# Altium footprint library ACTION_PinHeader.PcbLib: 155 footprints (part 3 of 10)
Each footprint in its own frame and in the unit in brackets; x right, y up, seen from the top. Pads: shape width x height; smd on the part's side, far side on the other; paste and mask are expansions set on the pad; w line width, h text height; cw(c..) or ccw(c..) is an arc to the next point about the centre after c.
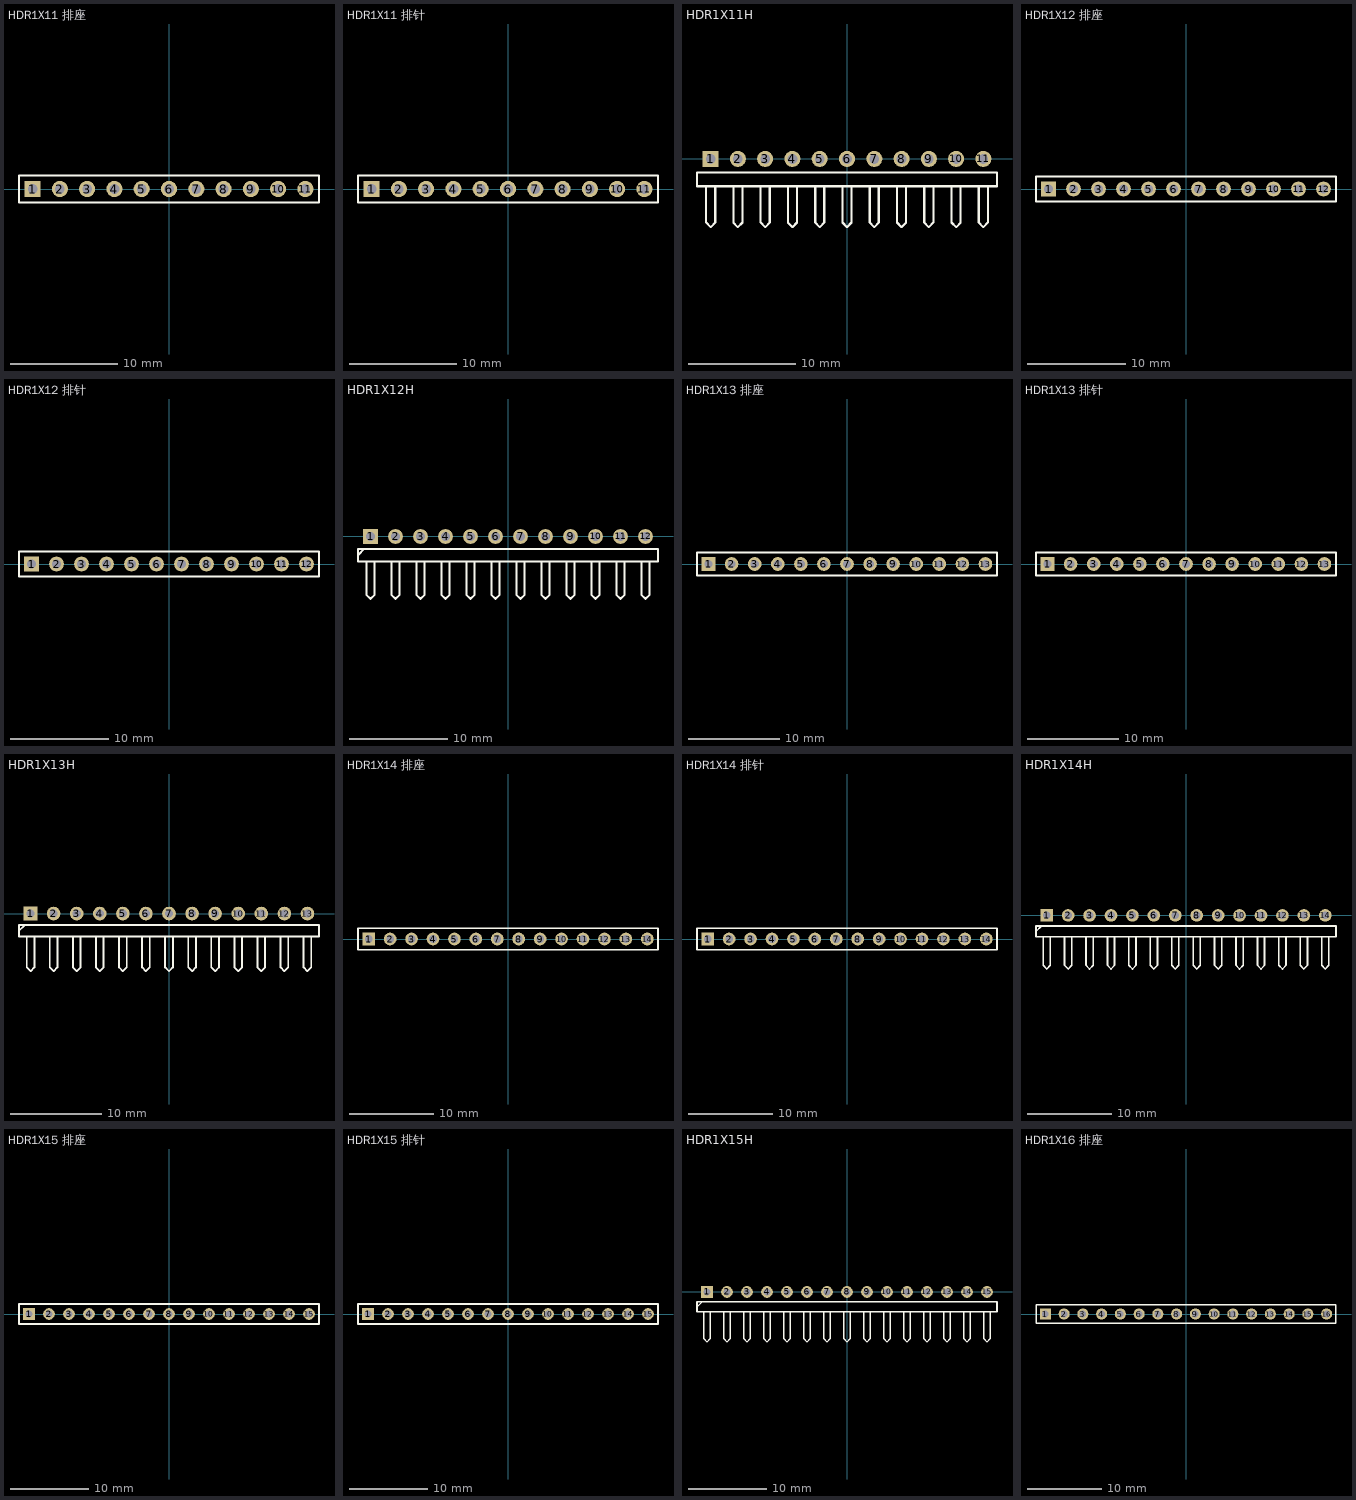
[diagram p2: the footprints below, top view; thin cyan lines are the x and y axes]

## HDR1X11 排座 [mm] "Connector; Header; 11 Position"
pads (11):
  rect 1.5x1.5 hole 0.9: 1(-12.7,0)
  round 1.5 hole 0.9: 2(-10.16,0) 3(-7.62,0) 4(-5.08,0) 5(-2.54,0) 6(0,0) 7(2.54,0) 8(5.08,0) 9(7.62,0) 10(10.16,0) 11(12.7,0)
Top Overlay:
  lines w0.2: -13.97,-1.27 13.97,-1.27 13.97,1.27 -12.065,1.27 -13.97,1.27 -13.97,-1.27
3D body "pcb_connector_801-87-011-66-001101.stp": height 7, standoff -3.8, extent -13.97,-1.27 13.97,1.27

## HDR1X11 排针 [mm] "Connector; Header; 11 Position"
pads (11):
  rect 1.5x1.5 hole 0.9: 1(-12.7,0)
  round 1.5 hole 0.9: 2(-10.16,0) 3(-7.62,0) 4(-5.08,0) 5(-2.54,0) 6(0,0) 7(2.54,0) 8(5.08,0) 9(7.62,0) 10(10.16,0) 11(12.7,0)
Top Overlay:
  lines w0.2: -13.97,-1.27 -13.97,1.27 -12.065,1.27 13.97,1.27 13.97,-1.27 -13.97,-1.27
3D body "HEADER 11.STEP": height 10.1, standoff -1.5, extent -13.945,-1.27 13.995,1.27

## HDR1X11H [mm] "Connector; Header; 11 Position; Right Angle"
pads (11):
  rect 1.5x1.5 hole 0.9: 1(-12.7,0)
  round 1.5 hole 0.9: 2(-10.16,0) 3(-7.62,0) 4(-5.08,0) 5(-2.54,0) 6(0,0) 7(2.54,0) 8(5.08,0) 9(7.62,0) 10(10.16,0) 11(12.7,0)
Top Overlay:
  lines w0.2: -13.123,-2.54 -13.123,-5.927 -12.7,-6.35 -12.277,-5.927 -12.277,-2.54 ; -10.583,-2.54 -10.583,-5.927 -10.16,-6.35 -9.737,-5.927 -9.737,-2.54 ; -8.043,-2.54 -8.043,-5.927 -7.62,-6.35 -7.197,-5.927 -7.197,-2.54 ; -5.503,-2.54 -5.503,-5.927 -5.08,-6.35 -4.657,-5.927 -4.657,-2.54 ; -2.963,-2.54 -2.963,-5.927 -2.54,-6.35 -2.117,-5.927 -2.117,-2.54 ; -0.423,-2.54 -0.423,-5.927 0,-6.35 0.423,-5.927 0.423,-2.54 ; 2.117,-2.54 2.117,-5.927 2.54,-6.35 2.963,-5.927 2.963,-2.54 ; 4.657,-2.54 4.657,-5.927 5.08,-6.35 5.503,-5.927 5.503,-2.54 ; 7.197,-2.54 7.197,-5.927 7.62,-6.35 8.043,-5.927 8.043,-2.54 ; 9.737,-2.54 9.737,-5.927 10.16,-6.35 10.583,-5.927 10.583,-2.54 ; 12.277,-2.54 12.277,-5.927 12.7,-6.35 13.123,-5.927 13.123,-2.54 ; -13.97,-2.54 13.97,-2.54 13.97,-1.27 -13.97,-1.27 -13.97,-2.54
3D body "HEADER 11H.STEP": height 4.33, standoff -3, extent -13.97,-6.949 13.97,1.321

## HDR1X12 排座 [mm] "Connector; Header; 12 Position"
pads (12):
  rect 1.5x1.5 hole 0.9: 1(-13.97,0)
  round 1.5 hole 0.9: 2(-11.43,0) 3(-8.89,0) 4(-6.35,0) 5(-3.81,0) 6(-1.27,0) 7(1.27,0) 8(3.81,0) 9(6.35,0) 10(8.89,0) 11(11.43,0) 12(13.97,0)
Top Overlay:
  lines w0.2: -15.24,-1.27 -15.24,1.27 -13.335,1.27 15.24,1.27 15.24,-1.27 -15.24,-1.27
3D body "pcb_connector_801-87-012-66-001101.stp": height 7, standoff -3.8, extent -15.24,-1.27 15.24,1.27

## HDR1X12 排针 [mm] "Connector; Header; 12 Position"
pads (12):
  rect 1.5x1.5 hole 0.9: 1(-13.97,0)
  round 1.5 hole 0.9: 2(-11.43,0) 3(-8.89,0) 4(-6.35,0) 5(-3.81,0) 6(-1.27,0) 7(1.27,0) 8(3.81,0) 9(6.35,0) 10(8.89,0) 11(11.43,0) 12(13.97,0)
Top Overlay:
  lines w0.2: -15.24,-1.27 15.24,-1.27 15.24,1.27 -13.335,1.27 -15.24,1.27 -15.24,-1.27
3D body "HEADER 12.STEP": height 10.1, standoff -1.5, extent -15.24,-1.245 15.24,1.295

## HDR1X12H [mm] "Connector; Header; 12 Position; Right Angle"
pads (12):
  rect 1.5x1.5 hole 0.9: 1(-13.97,0)
  round 1.5 hole 0.9: 2(-11.43,0) 3(-8.89,0) 4(-6.35,0) 5(-3.81,0) 6(-1.27,0) 7(1.27,0) 8(3.81,0) 9(6.35,0) 10(8.89,0) 11(11.43,0) 12(13.97,0)
Top Overlay:
  lines w0.2: -15.24,-1.905 -14.605,-1.27 ; -14.393,-2.54 -14.393,-5.927 -13.97,-6.35 -13.547,-5.927 -13.547,-2.54 ; -11.853,-2.54 -11.853,-5.927 -11.43,-6.35 -11.007,-5.927 -11.007,-2.54 ; -9.313,-2.54 -9.313,-5.927 -8.89,-6.35 -8.467,-5.927 -8.467,-2.54 ; -6.773,-2.54 -6.773,-5.927 -6.35,-6.35 -5.927,-5.927 -5.927,-2.54 ; -4.233,-2.54 -4.233,-5.927 -3.81,-6.35 -3.387,-5.927 -3.387,-2.54 ; -1.693,-2.54 -1.693,-5.927 -1.27,-6.35 -0.847,-5.927 -0.847,-2.54 ; 0.847,-2.54 0.847,-5.927 1.27,-6.35 1.693,-5.927 1.693,-2.54 ; 3.387,-2.54 3.387,-5.927 3.81,-6.35 4.233,-5.927 4.233,-2.54 ; 5.927,-2.54 5.927,-5.927 6.35,-6.35 6.773,-5.927 6.773,-2.54 ; 8.467,-2.54 8.467,-5.927 8.89,-6.35 9.313,-5.927 9.313,-2.54 ; 11.007,-2.54 11.007,-5.927 11.43,-6.35 11.853,-5.927 11.853,-2.54 ; 13.547,-2.54 13.547,-5.927 13.97,-6.35 14.393,-5.927 14.393,-2.54 ; -15.24,-2.54 -15.24,-1.27 -13.335,-1.27 15.24,-1.27 15.24,-2.54 -15.24,-2.54
3D body "HEADER 12H.STEP": height 4.33, standoff -3, extent -15.24,-7.025 15.24,1.245

## HDR1X13 排座 [mm] "Connector; Header; 13 Position"
pads (13):
  rect 1.5x1.5 hole 0.9: 1(-15.24,0)
  round 1.5 hole 0.9: 2(-12.7,0) 3(-10.16,0) 4(-7.62,0) 5(-5.08,0) 6(-2.54,0) 7(0,0) 8(2.54,0) 9(5.08,0) 10(7.62,0) 11(10.16,0) 12(12.7,0) 13(15.24,0)
Top Overlay:
  lines w0.2: -16.51,-1.27 16.51,-1.27 16.51,1.27 -14.605,1.27 -16.51,1.27 -16.51,-1.27
3D body "pcb_connector_801-87-013-66-001101.stp": height 7, standoff -3.8, extent -16.51,-1.27 16.51,1.27

## HDR1X13 排针 [mm] "Connector; Header; 13 Position"
pads (13):
  rect 1.5x1.5 hole 0.9: 1(-15.24,0)
  round 1.5 hole 0.9: 2(-12.7,0) 3(-10.16,0) 4(-7.62,0) 5(-5.08,0) 6(-2.54,0) 7(0,0) 8(2.54,0) 9(5.08,0) 10(7.62,0) 11(10.16,0) 12(12.7,0) 13(15.24,0)
Top Overlay:
  lines w0.2: -16.51,-1.27 -16.51,1.27 -14.605,1.27 16.51,1.27 16.51,-1.27 -16.51,-1.27
3D body "HEADER 13.STEP": height 10.1, standoff -1.5, extent -16.51,-1.27 16.51,1.27

## HDR1X13H [mm] "Connector; Header; 13 Position; Right Angle"
pads (13):
  rect 1.5x1.5 hole 0.9: 1(-15.24,0)
  round 1.5 hole 0.9: 2(-12.7,0) 3(-10.16,0) 4(-7.62,0) 5(-5.08,0) 6(-2.54,0) 7(0,0) 8(2.54,0) 9(5.08,0) 10(7.62,0) 11(10.16,0) 12(12.7,0) 13(15.24,0)
Top Overlay:
  lines w0.2: -16.51,-1.905 -15.875,-1.27 ; -15.663,-2.54 -15.663,-5.927 -15.24,-6.35 -14.817,-5.927 -14.817,-2.54 ; -13.123,-2.54 -13.123,-5.927 -12.7,-6.35 -12.277,-5.927 -12.277,-2.54 ; -10.583,-2.54 -10.583,-5.927 -10.16,-6.35 -9.737,-5.927 -9.737,-2.54 ; -8.043,-2.54 -8.043,-5.927 -7.62,-6.35 -7.197,-5.927 -7.197,-2.54 ; -5.503,-2.54 -5.503,-5.927 -5.08,-6.35 -4.657,-5.927 -4.657,-2.54 ; -2.963,-2.54 -2.963,-5.927 -2.54,-6.35 -2.117,-5.927 -2.117,-2.54 ; -0.423,-2.54 -0.423,-5.927 0,-6.35 0.423,-5.927 0.423,-2.54 ; 2.117,-2.54 2.117,-5.927 2.54,-6.35 2.963,-5.927 2.963,-2.54 ; 4.657,-2.54 4.657,-5.927 5.08,-6.35 5.503,-5.927 5.503,-2.54 ; 7.197,-2.54 7.197,-5.927 7.62,-6.35 8.043,-5.927 8.043,-2.54 ; 9.737,-2.54 9.737,-5.927 10.16,-6.35 10.583,-5.927 10.583,-2.54 ; 12.277,-2.54 12.277,-5.927 12.7,-6.35 13.123,-5.927 13.123,-2.54 ; 14.817,-2.54 14.817,-5.927 15.24,-6.35 15.663,-5.927 15.663,-2.54 ; -16.51,-2.54 -16.51,-1.27 -14.605,-1.27 16.51,-1.27 16.51,-2.54 -16.51,-2.54
3D body "HEADER 13H.STEP": height 4.33, standoff -3, extent -16.485,-7.051 16.535,1.219

## HDR1X14 排座 [mm] "Connector; Header; 14 Position"
pads (14):
  rect 1.5x1.5 hole 0.9: 1(-16.51,0)
  round 1.5 hole 0.9: 2(-13.97,0) 3(-11.43,0) 4(-8.89,0) 5(-6.35,0) 6(-3.81,0) 7(-1.27,0) 8(1.27,0) 9(3.81,0) 10(6.35,0) 11(8.89,0) 12(11.43,0) 13(13.97,0) 14(16.51,0)
Top Overlay:
  lines w0.2: -17.78,-1.27 17.78,-1.27 17.78,1.27 -15.875,1.27 -17.78,1.27 -17.78,-1.27
3D body "pcb_connector_801-87-014-66-001101.stp": height 7, standoff -3.8, extent -17.78,-1.27 17.78,1.27

## HDR1X14 排针 [mm] "Connector; Header; 14 Position"
pads (14):
  rect 1.5x1.5 hole 0.9: 1(-16.51,0)
  round 1.5 hole 0.9: 2(-13.97,0) 3(-11.43,0) 4(-8.89,0) 5(-6.35,0) 6(-3.81,0) 7(-1.27,0) 8(1.27,0) 9(3.81,0) 10(6.35,0) 11(8.89,0) 12(11.43,0) 13(13.97,0) 14(16.51,0)
Top Overlay:
  lines w0.2: -17.78,-1.27 -17.78,1.27 -15.875,1.27 17.78,1.27 17.78,-1.27 -17.78,-1.27

## HDR1X14H [mm] "Connector; Header; 14 Position; Right Angle"
pads (14):
  rect 1.5x1.5 hole 0.9: 1(-16.51,0)
  round 1.5 hole 0.9: 2(-13.97,0) 3(-11.43,0) 4(-8.89,0) 5(-6.35,0) 6(-3.81,0) 7(-1.27,0) 8(1.27,0) 9(3.81,0) 10(6.35,0) 11(8.89,0) 12(11.43,0) 13(13.97,0) 14(16.51,0)
Top Overlay:
  lines w0.2: -17.78,-1.905 -17.145,-1.27 ; -16.933,-2.54 -16.933,-5.927 -16.51,-6.35 -16.087,-5.927 -16.087,-2.54 ; -14.393,-2.54 -14.393,-5.927 -13.97,-6.35 -13.547,-5.927 -13.547,-2.54 ; -11.853,-2.54 -11.853,-5.927 -11.43,-6.35 -11.007,-5.927 -11.007,-2.54 ; -9.313,-2.54 -9.313,-5.927 -8.89,-6.35 -8.467,-5.927 -8.467,-2.54 ; -6.773,-2.54 -6.773,-5.927 -6.35,-6.35 -5.927,-5.927 -5.927,-2.54 ; -4.233,-2.54 -4.233,-5.927 -3.81,-6.35 -3.387,-5.927 -3.387,-2.54 ; -1.693,-2.54 -1.693,-5.927 -1.27,-6.35 -0.847,-5.927 -0.847,-2.54 ; 0.847,-2.54 0.847,-5.927 1.27,-6.35 1.693,-5.927 1.693,-2.54 ; 3.387,-2.54 3.387,-5.927 3.81,-6.35 4.233,-5.927 4.233,-2.54 ; 5.927,-2.54 5.927,-5.927 6.35,-6.35 6.773,-5.927 6.773,-2.54 ; 8.467,-2.54 8.467,-5.927 8.89,-6.35 9.313,-5.927 9.313,-2.54 ; 11.007,-2.54 11.007,-5.927 11.43,-6.35 11.853,-5.927 11.853,-2.54 ; 13.547,-2.54 13.547,-5.927 13.97,-6.35 14.393,-5.927 14.393,-2.54 ; 16.087,-2.54 16.087,-5.927 16.51,-6.35 16.933,-5.927 16.933,-2.54 ; -17.78,-2.54 17.78,-2.54 17.78,-1.27 -15.875,-1.27 -17.78,-1.27 -17.78,-2.54
3D body "HEADER 14H.STEP": height 4.33, standoff -3, extent -17.78,-7.051 17.78,1.219

## HDR1X15 排座 [mm] "Connector; Header; 15 Position"
pads (15):
  rect 1.5x1.5 hole 0.9: 1(-17.78,0)
  round 1.5 hole 0.9: 2(-15.24,0) 3(-12.7,0) 4(-10.16,0) 5(-7.62,0) 6(-5.08,0) 7(-2.54,0) 8(0,0) 9(2.54,0) 10(5.08,0) 11(7.62,0) 12(10.16,0) 13(12.7,0) 14(15.24,0) 15(17.78,0)
Top Overlay:
  lines w0.2: -19.05,-1.27 19.05,-1.27 19.05,1.27 -17.145,1.27 -19.05,1.27 -19.05,-1.27
3D body "pcb_connector_801-87-015-66-001101.stp": height 7, standoff -3.8, extent -19.05,-1.27 19.05,1.27

## HDR1X15 排针 [mm] "Connector; Header; 15 Position"
pads (15):
  rect 1.5x1.5 hole 0.9: 1(-17.78,0)
  round 1.5 hole 0.9: 2(-15.24,0) 3(-12.7,0) 4(-10.16,0) 5(-7.62,0) 6(-5.08,0) 7(-2.54,0) 8(0,0) 9(2.54,0) 10(5.08,0) 11(7.62,0) 12(10.16,0) 13(12.7,0) 14(15.24,0) 15(17.78,0)
Top Overlay:
  lines w0.2: -19.05,-1.27 -19.05,1.27 -17.145,1.27 19.05,1.27 19.05,-1.27 -19.05,-1.27
3D body "HEADER 15.STEP": height 10.1, standoff -1.5, extent -19.101,-1.295 18.999,1.245

## HDR1X15H [mm] "Connector; Header; 15 Position; Right Angle"
pads (15):
  rect 1.5x1.5 hole 0.9: 1(-17.78,0)
  round 1.5 hole 0.9: 2(-15.24,0) 3(-12.7,0) 4(-10.16,0) 5(-7.62,0) 6(-5.08,0) 7(-2.54,0) 8(0,0) 9(2.54,0) 10(5.08,0) 11(7.62,0) 12(10.16,0) 13(12.7,0) 14(15.24,0) 15(17.78,0)
Top Overlay:
  lines w0.2: -19.05,-1.905 -18.415,-1.27 ; -18.203,-2.54 -18.203,-5.927 -17.78,-6.35 -17.357,-5.927 -17.357,-2.54 ; -15.663,-2.54 -15.663,-5.927 -15.24,-6.35 -14.817,-5.927 -14.817,-2.54 ; -13.123,-2.54 -13.123,-5.927 -12.7,-6.35 -12.277,-5.927 -12.277,-2.54 ; -10.583,-2.54 -10.583,-5.927 -10.16,-6.35 -9.737,-5.927 -9.737,-2.54 ; -8.043,-2.54 -8.043,-5.927 -7.62,-6.35 -7.197,-5.927 -7.197,-2.54 ; -5.503,-2.54 -5.503,-5.927 -5.08,-6.35 -4.657,-5.927 -4.657,-2.54 ; -2.963,-2.54 -2.963,-5.927 -2.54,-6.35 -2.117,-5.927 -2.117,-2.54 ; -0.423,-2.54 -0.423,-5.927 0,-6.35 0.423,-5.927 0.423,-2.54 ; 2.117,-2.54 2.117,-5.927 2.54,-6.35 2.963,-5.927 2.963,-2.54 ; 4.657,-2.54 4.657,-5.927 5.08,-6.35 5.503,-5.927 5.503,-2.54 ; 7.197,-2.54 7.197,-5.927 7.62,-6.35 8.043,-5.927 8.043,-2.54 ; 9.737,-2.54 9.737,-5.927 10.16,-6.35 10.583,-5.927 10.583,-2.54 ; 12.277,-2.54 12.277,-5.927 12.7,-6.35 13.123,-5.927 13.123,-2.54 ; 14.817,-2.54 14.817,-5.927 15.24,-6.35 15.663,-5.927 15.663,-2.54 ; 17.357,-2.54 17.357,-5.927 17.78,-6.35 18.203,-5.927 18.203,-2.54 ; -19.05,-2.54 -19.05,-1.27 -17.145,-1.27 19.05,-1.27 19.05,-2.54 -19.05,-2.54
3D body "HEADER 15H.STEP": height 4.33, standoff -3, extent -19.05,-6.975 19.05,1.295

## HDR1X16 排座 [mm] "Connector; Header; 16 Position"
pads (16):
  rect 1.5x1.5 hole 0.9: 1(-19.05,0)
  round 1.5 hole 0.9: 2(-16.51,0) 3(-13.97,0) 4(-11.43,0) 5(-8.89,0) 6(-6.35,0) 7(-3.81,0) 8(-1.27,0) 9(1.27,0) 10(3.81,0) 11(6.35,0) 12(8.89,0) 13(11.43,0) 14(13.97,0) 15(16.51,0) 16(19.05,0)
Top Overlay:
  lines w0.2: -20.32,-1.27 -20.32,1.27 -18.415,1.27 20.32,1.27 20.32,-1.27 -20.32,-1.27
3D body "pcb_connector_801-87-016-66-001101.stp": height 7, standoff -3.8, extent -20.32,-1.27 20.32,1.27